# Altium integrated library Samtec 2 mm Pitch Terminal Strips.IntLib: 623 symbols (part 1 of 5)
Pins are listed as number, name and electrical type; pins without a type are passive.

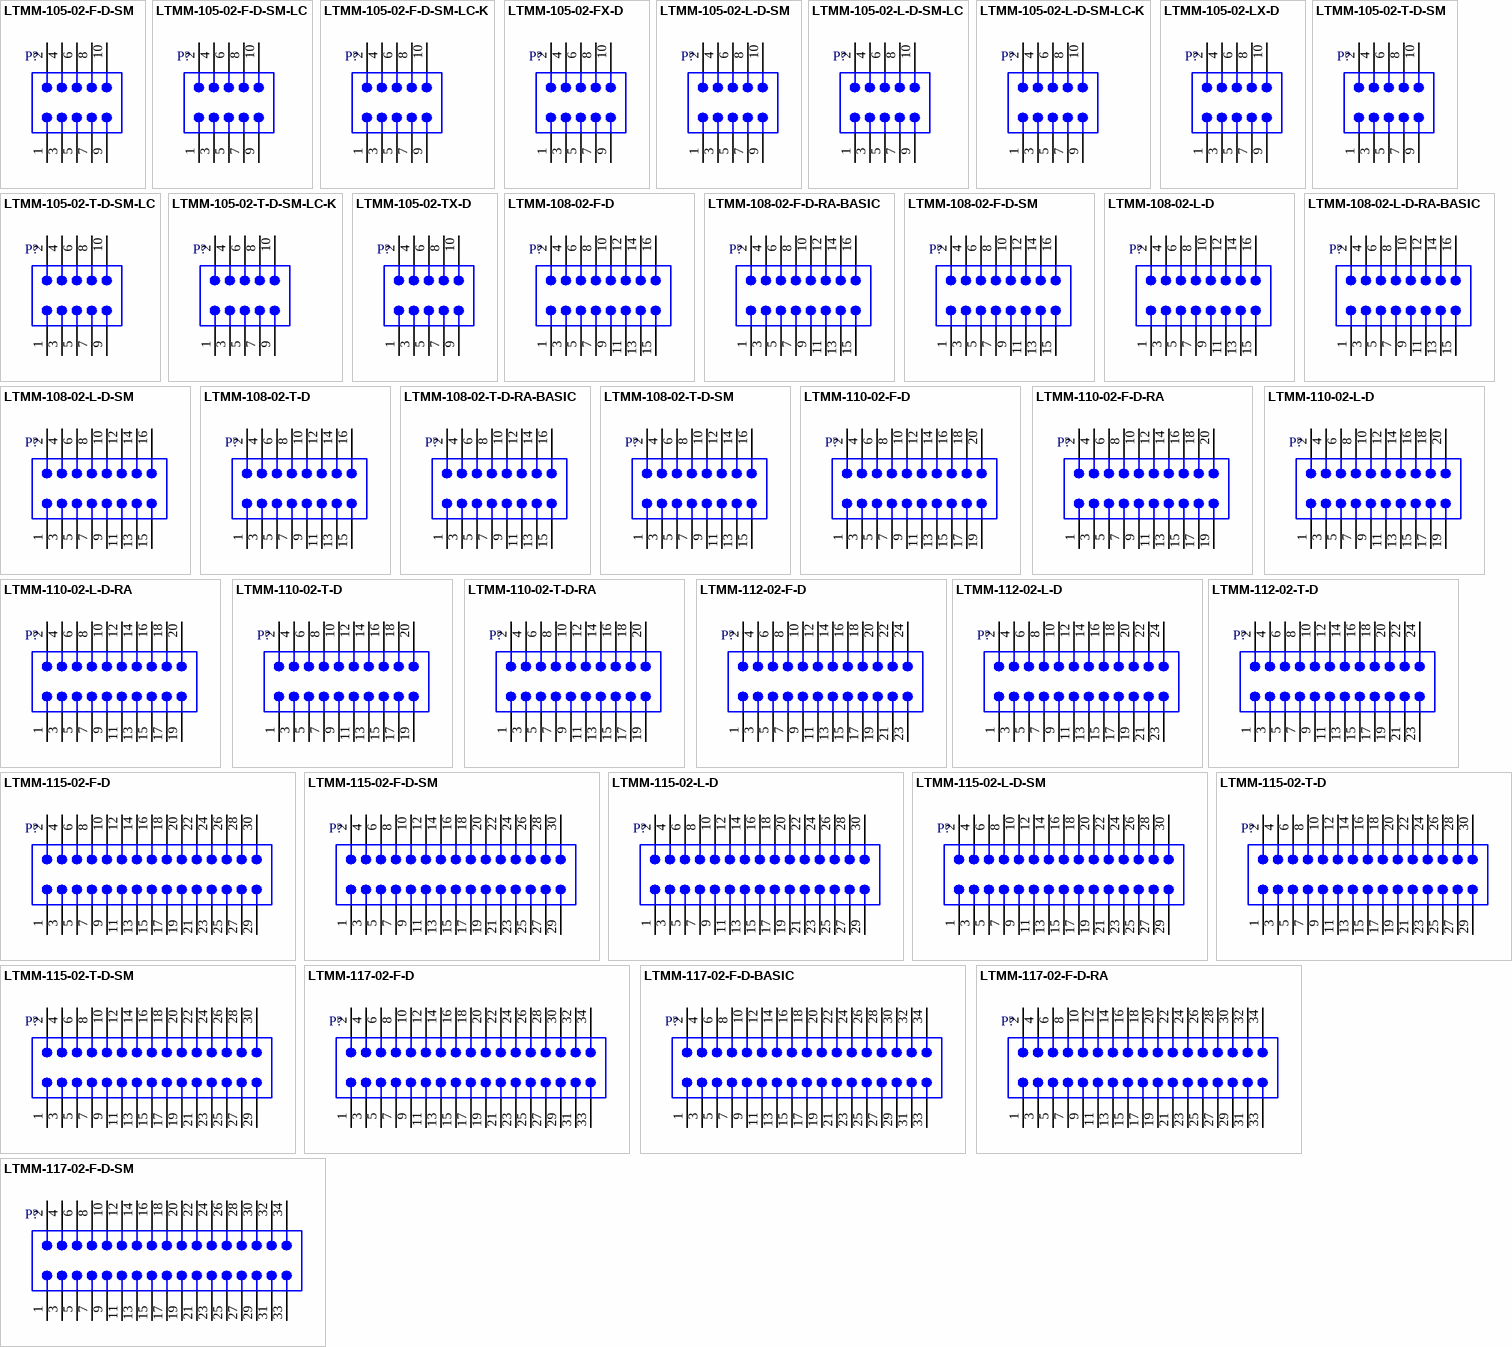
[diagram p0: symbols LTMM-105-02-F-D-SM to LTMM-117-02-F-D-SM]

## LTMM-105-02-F-D-SM
designator P?
Shrouded Header & Stacker, Surface Mount, Vertical, -55 to 125 degC, 2 mm Pitch, 10-Pin, Male, RoHS; Manufacturer: Samtec; PartNumber: LTMM-105-02-F-D-SM; Pitch: 2 mm; DatasheetVersion: F-214; PackageVersion: AQ, 5/1992; PackageReference: LTMM-105-02-X-D-SM; PackageDescription: LTMM Assembly; Orientation: Vertical; RoHS: True; Temperature Range: -55 to 125 degC; Mounting Technology: Surface Mount; ComponentLink1Description: Manufacturer URL; ComponentLink1URL: http://www.samtec.com; ComponentLink2Description: Datasheet; ComponentLink2URL: http://d2a072wq521u33.cloudfront.net/catalog_english//LTMM.PDF; ComponentLink3Description: Package Specification; ComponentLink3URL: http://www.samtec.com/documents/webfiles/cpdf/LTMM-1XX-XX-XX-D-XX-XX-MKT.pdf
footprint SMTC-LTMM-105-02-X-D-SM (Shrouded Header & Stacker, 2x5 Pins, Vertical, 2mm Pitch, Male)
pins: 1, 2, 3, 4, 5, 6, 7, 8, 9, 10

## LTMM-105-02-F-D-SM-LC
designator P?
Shrouded Header & Stacker, Surface Mount, Vertical, -55 to 125 degC, 2 mm Pitch, 10-Pin, Male, RoHS; Manufacturer: Samtec; PartNumber: LTMM-105-02-F-D-SM-LC; Pitch: 2 mm; DatasheetVersion: F-214; PackageVersion: AQ, 5/1992; PackageReference: LTMM-105-02-X-D-SM-LC; PackageDescription: LTMM Assembly; Orientation: Vertical; RoHS: True; Temperature Range: -55 to 125 degC; Mounting Technology: Surface Mount; ComponentLink1Description: Manufacturer URL; ComponentLink1URL: http://www.samtec.com; ComponentLink2Description: Datasheet; ComponentLink2URL: http://d2a072wq521u33.cloudfront.net/catalog_english//LTMM.PDF; ComponentLink3Description: Package Specification; ComponentLink3URL: http://www.samtec.com/documents/webfiles/cpdf/LTMM-1XX-XX-XX-D-XX-XX-MKT.pdf
footprint SMTC-LTMM-105-02-X-D-SM-LC (Shrouded Header & Stacker, 2x5 Pins, Vertical, 2mm Pitch, Male)
pins: 1, 2, 3, 4, 5, 6, 7, 8, 9, 10

## LTMM-105-02-F-D-SM-LC-K
designator P?
Shrouded Header & Stacker, Surface Mount, Vertical, -55 to 125 degC, 2 mm Pitch, 10-Pin, Male, RoHS; Manufacturer: Samtec; PartNumber: LTMM-105-02-F-D-SM-LC-K; Pitch: 2 mm; DatasheetVersion: F-214; PackageVersion: AQ, 5/1992; PackageReference: LTMM-105-02-X-D-SM-LC-K; PackageDescription: LTMM Assembly; Orientation: Vertical; RoHS: True; Temperature Range: -55 to 125 degC; Mounting Technology: Surface Mount; ComponentLink1Description: Manufacturer URL; ComponentLink1URL: http://www.samtec.com; ComponentLink2Description: Datasheet; ComponentLink2URL: http://d2a072wq521u33.cloudfront.net/catalog_english//LTMM.PDF; ComponentLink3Description: Package Specification; ComponentLink3URL: http://www.samtec.com/documents/webfiles/cpdf/LTMM-1XX-XX-XX-D-XX-XX-MKT.pdf
footprint SMTC-LTMM-105-02-X-D-SM-LC-K (Shrouded Header & Stacker, 2x5 Pins, Vertical, 2mm Pitch, Male)
pins: 1, 2, 3, 4, 5, 6, 7, 8, 9, 10

## LTMM-105-02-FX-D
designator P?
Shrouded Header & Stacker, Through-Hole, Vertical, -55 to 125 degC, 2 mm Pitch, 10-Pin, Male, RoHS; Manufacturer: Samtec; PartNumber: LTMM-105-02-FX-D; Pitch: 2 mm; DatasheetVersion: F-214; PackageVersion: AQ, 5/1992; PackageReference: LTMM-105-02-XX-D; PackageDescription: LTMM Assembly; Orientation: Vertical; RoHS: True; Temperature Range: -55 to 125 degC; Mounting Technology: Through-hole; ComponentLink1Description: Manufacturer URL; ComponentLink1URL: http://www.samtec.com; ComponentLink2Description: Datasheet; ComponentLink2URL: http://d2a072wq521u33.cloudfront.net/catalog_english//LTMM.PDF; ComponentLink3Description: Package Specification; ComponentLink3URL: http://www.samtec.com/documents/webfiles/cpdf/LTMM-1XX-XX-XX-D-XX-XX-MKT.pdf
footprint SMTC-LTMM-105-02-XX-D (Shrouded Header & Stacker, 2x5 Pins, Vertical, 2mm Pitch, Male)
pins: 1, 2, 3, 4, 5, 6, 7, 8, 9, 10

## LTMM-105-02-L-D-SM
designator P?
Shrouded Header & Stacker, Surface Mount, Vertical, -55 to 125 degC, 2 mm Pitch, 10-Pin, Male, RoHS; Manufacturer: Samtec; PartNumber: LTMM-105-02-L-D-SM; Pitch: 2 mm; DatasheetVersion: F-214; PackageVersion: AQ, 5/1992; PackageReference: LTMM-105-02-X-D-SM; PackageDescription: LTMM Assembly; Supplier 1: Newark; Supplier Part Number 1: 85T5470; Orientation: Vertical; RoHS: True; Temperature Range: -55 to 125 degC; Mounting Technology: Surface Mount; ComponentLink1Description: Manufacturer URL; ComponentLink1URL: http://www.samtec.com; ComponentLink2Description: Datasheet; ComponentLink2URL: http://d2a072wq521u33.cloudfront.net/catalog_english//LTMM.PDF; ComponentLink3Description: Package Specification; ComponentLink3URL: http://www.samtec.com/documents/webfiles/cpdf/LTMM-1XX-XX-XX-D-XX-XX-MKT.pdf
footprint SMTC-LTMM-105-02-X-D-SM (Shrouded Header & Stacker, 2x5 Pins, Vertical, 2mm Pitch, Male)
pins: 1, 2, 3, 4, 5, 6, 7, 8, 9, 10

## LTMM-105-02-L-D-SM-LC
designator P?
Shrouded Header & Stacker, Surface Mount, Vertical, -55 to 125 degC, 2 mm Pitch, 10-Pin, Male, RoHS; Manufacturer: Samtec; PartNumber: LTMM-105-02-L-D-SM-LC; Pitch: 2 mm; DatasheetVersion: F-214; PackageVersion: AQ, 5/1992; PackageReference: LTMM-105-02-X-D-SM-LC; PackageDescription: LTMM Assembly; Orientation: Vertical; RoHS: True; Temperature Range: -55 to 125 degC; Mounting Technology: Surface Mount; ComponentLink1Description: Manufacturer URL; ComponentLink1URL: http://www.samtec.com; ComponentLink2Description: Datasheet; ComponentLink2URL: http://d2a072wq521u33.cloudfront.net/catalog_english//LTMM.PDF; ComponentLink3Description: Package Specification; ComponentLink3URL: http://www.samtec.com/documents/webfiles/cpdf/LTMM-1XX-XX-XX-D-XX-XX-MKT.pdf
footprint SMTC-LTMM-105-02-X-D-SM-LC (Shrouded Header & Stacker, 2x5 Pins, Vertical, 2mm Pitch, Male)
pins: 1, 2, 3, 4, 5, 6, 7, 8, 9, 10

## LTMM-105-02-L-D-SM-LC-K
designator P?
Shrouded Header & Stacker, Surface Mount, Vertical, -55 to 125 degC, 2 mm Pitch, 10-Pin, Male, RoHS; Manufacturer: Samtec; PartNumber: LTMM-105-02-L-D-SM-LC-K; Pitch: 2 mm; DatasheetVersion: F-214; PackageVersion: AQ, 5/1992; PackageReference: LTMM-105-02-X-D-SM-LC-K; PackageDescription: LTMM Assembly; Orientation: Vertical; RoHS: True; Temperature Range: -55 to 125 degC; Mounting Technology: Surface Mount; ComponentLink1Description: Manufacturer URL; ComponentLink1URL: http://www.samtec.com; ComponentLink2Description: Datasheet; ComponentLink2URL: http://d2a072wq521u33.cloudfront.net/catalog_english//LTMM.PDF; ComponentLink3Description: Package Specification; ComponentLink3URL: http://www.samtec.com/documents/webfiles/cpdf/LTMM-1XX-XX-XX-D-XX-XX-MKT.pdf
footprint SMTC-LTMM-105-02-X-D-SM-LC-K (Shrouded Header & Stacker, 2x5 Pins, Vertical, 2mm Pitch, Male)
pins: 1, 2, 3, 4, 5, 6, 7, 8, 9, 10

## LTMM-105-02-LX-D
designator P?
Shrouded Header & Stacker, Through-Hole, Vertical, -55 to 125 degC, 2 mm Pitch, 10-Pin, Male, RoHS; Manufacturer: Samtec; PartNumber: LTMM-105-02-LX-D; Pitch: 2 mm; DatasheetVersion: F-214; PackageVersion: AQ, 5/1992; PackageReference: LTMM-105-02-XX-D; PackageDescription: LTMM Assembly; Orientation: Vertical; RoHS: True; Temperature Range: -55 to 125 degC; Mounting Technology: Through-hole; ComponentLink1Description: Manufacturer URL; ComponentLink1URL: http://www.samtec.com; ComponentLink2Description: Datasheet; ComponentLink2URL: http://d2a072wq521u33.cloudfront.net/catalog_english//LTMM.PDF; ComponentLink3Description: Package Specification; ComponentLink3URL: http://www.samtec.com/documents/webfiles/cpdf/LTMM-1XX-XX-XX-D-XX-XX-MKT.pdf
footprint SMTC-LTMM-105-02-XX-D (Shrouded Header & Stacker, 2x5 Pins, Vertical, 2mm Pitch, Male)
pins: 1, 2, 3, 4, 5, 6, 7, 8, 9, 10

## LTMM-105-02-T-D-SM
designator P?
Shrouded Header & Stacker, Surface Mount, Vertical, -55 to 105 degC, 2 mm Pitch, 10-Pin, Male, RoHS; Manufacturer: Samtec; PartNumber: LTMM-105-02-T-D-SM; Pitch: 2 mm; DatasheetVersion: F-214; PackageVersion: AQ, 5/1992; PackageReference: LTMM-105-02-X-D-SM; PackageDescription: LTMM Assembly; Supplier 1: Newark; Supplier Part Number 1: 85T5472; Orientation: Vertical; RoHS: True; Temperature Range: -55 to 105 degC; Mounting Technology: Surface Mount; ComponentLink1Description: Manufacturer URL; ComponentLink1URL: http://www.samtec.com; ComponentLink2Description: Datasheet; ComponentLink2URL: http://d2a072wq521u33.cloudfront.net/catalog_english//LTMM.PDF; ComponentLink3Description: Package Specification; ComponentLink3URL: http://www.samtec.com/documents/webfiles/cpdf/LTMM-1XX-XX-XX-D-XX-XX-MKT.pdf
footprint SMTC-LTMM-105-02-X-D-SM (Shrouded Header & Stacker, 2x5 Pins, Vertical, 2mm Pitch, Male)
pins: 1, 2, 3, 4, 5, 6, 7, 8, 9, 10

## LTMM-105-02-T-D-SM-LC
designator P?
Shrouded Header & Stacker, Surface Mount, Vertical, -55 to 105 degC, 2 mm Pitch, 10-Pin, Male, RoHS; Manufacturer: Samtec; PartNumber: LTMM-105-02-T-D-SM-LC; Pitch: 2 mm; DatasheetVersion: F-214; PackageVersion: AQ, 5/1992; PackageReference: LTMM-105-02-X-D-SM-LC; PackageDescription: LTMM Assembly; Orientation: Vertical; RoHS: True; Temperature Range: -55 to 105 degC; Mounting Technology: Surface Mount; ComponentLink1Description: Manufacturer URL; ComponentLink1URL: http://www.samtec.com; ComponentLink2Description: Datasheet; ComponentLink2URL: http://d2a072wq521u33.cloudfront.net/catalog_english//LTMM.PDF; ComponentLink3Description: Package Specification; ComponentLink3URL: http://www.samtec.com/documents/webfiles/cpdf/LTMM-1XX-XX-XX-D-XX-XX-MKT.pdf
footprint SMTC-LTMM-105-02-X-D-SM-LC (Shrouded Header & Stacker, 2x5 Pins, Vertical, 2mm Pitch, Male)
pins: 1, 2, 3, 4, 5, 6, 7, 8, 9, 10

## LTMM-105-02-T-D-SM-LC-K
designator P?
Shrouded Header & Stacker, Surface Mount, Vertical, -55 to 105 degC, 2 mm Pitch, 10-Pin, Male, RoHS; Manufacturer: Samtec; PartNumber: LTMM-105-02-T-D-SM-LC-K; Pitch: 2 mm; DatasheetVersion: F-214; PackageVersion: AQ, 5/1992; PackageReference: LTMM-105-02-X-D-SM-LC-K; PackageDescription: LTMM Assembly; Orientation: Vertical; RoHS: True; Temperature Range: -55 to 105 degC; Mounting Technology: Surface Mount; ComponentLink1Description: Manufacturer URL; ComponentLink1URL: http://www.samtec.com; ComponentLink2Description: Datasheet; ComponentLink2URL: http://d2a072wq521u33.cloudfront.net/catalog_english//LTMM.PDF; ComponentLink3Description: Package Specification; ComponentLink3URL: http://www.samtec.com/documents/webfiles/cpdf/LTMM-1XX-XX-XX-D-XX-XX-MKT.pdf
footprint SMTC-LTMM-105-02-X-D-SM-LC-K (Shrouded Header & Stacker, 2x5 Pins, Vertical, 2mm Pitch, Male)
pins: 1, 2, 3, 4, 5, 6, 7, 8, 9, 10

## LTMM-105-02-TX-D
designator P?
Shrouded Header & Stacker, Through-Hole, Vertical, -55 to 105 degC, 2 mm Pitch, 10-Pin, Male, RoHS; Manufacturer: Samtec; PartNumber: LTMM-105-02-TX-D; Pitch: 2 mm; DatasheetVersion: F-214; PackageVersion: AQ, 5/1992; PackageReference: LTMM-105-02-XX-D; PackageDescription: LTMM Assembly; Orientation: Vertical; RoHS: True; Temperature Range: -55 to 105 degC; Mounting Technology: Through-hole; ComponentLink1Description: Manufacturer URL; ComponentLink1URL: http://www.samtec.com; ComponentLink2Description: Datasheet; ComponentLink2URL: http://d2a072wq521u33.cloudfront.net/catalog_english//LTMM.PDF; ComponentLink3Description: Package Specification; ComponentLink3URL: http://www.samtec.com/documents/webfiles/cpdf/LTMM-1XX-XX-XX-D-XX-XX-MKT.pdf
footprint SMTC-LTMM-105-02-XX-D (Shrouded Header & Stacker, 2x5 Pins, Vertical, 2mm Pitch, Male)
pins: 1, 2, 3, 4, 5, 6, 7, 8, 9, 10

## LTMM-108-02-F-D
designator P?
Shrouded Header & Stacker, Through-Hole, Vertical, -55 to 125 degC, 2 mm Pitch, 16-Pin, Male, RoHS; Manufacturer: Samtec; PartNumber: LTMM-108-02-F-D; Pitch: 2 mm; DatasheetVersion: F-214; PackageVersion: AQ, 5/1992; PackageReference: LTMM-108-02-X-D; PackageDescription: LTMM Assembly; Orientation: Vertical; RoHS: True; Temperature Range: -55 to 125 degC; Mounting Technology: Through-hole; ComponentLink1Description: Manufacturer URL; ComponentLink1URL: http://www.samtec.com; ComponentLink2Description: Datasheet; ComponentLink2URL: http://d2a072wq521u33.cloudfront.net/catalog_english//LTMM.PDF; ComponentLink3Description: Package Specification; ComponentLink3URL: http://www.samtec.com/documents/webfiles/cpdf/LTMM-1XX-XX-XX-D-XX-XX-MKT.pdf
footprint SMTC-LTMM-108-02-X-D (Shrouded Header & Stacker, 2x8 Pins, Vertical, 2mm Pitch, Male)
pins: 1, 2, 3, 4, 5, 6, 7, 8, 9, 10, 11, 12, 13, 14, 15, 16

## LTMM-108-02-F-D-RA-BASIC
designator P?
Shrouded Header & Stacker, Through-Hole, Right Angle, -55 to 125 degC, 2 mm Pitch, 16-Pin, Male, RoHS; Manufacturer: Samtec; PartNumber: LTMM-108-02-F-D-RA-BASIC; Pitch: 2 mm; DatasheetVersion: F-214; PackageVersion: AQ, 5/1992; PackageReference: LTMM-108-02-X-D-RA-BASIC; PackageDescription: LTMM Assembly; Orientation: Right Angle; RoHS: True; Temperature Range: -55 to 125 degC; Mounting Technology: Through-hole; ComponentLink1Description: Manufacturer URL; ComponentLink1URL: http://www.samtec.com; ComponentLink2Description: Datasheet; ComponentLink2URL: http://d2a072wq521u33.cloudfront.net/catalog_english//LTMM.PDF; ComponentLink3Description: Package Specification; ComponentLink3URL: http://www.samtec.com/documents/webfiles/cpdf/LTMM-1XX-XX-XX-D-XX-XX-MKT.pdf
footprint SMTC-LTMM-108-02-X-D-RA-BASIC (Shrouded Header & Stacker, 2x8 Pins, Right Angle, 2mm Pitch, Male)
pins: 1, 2, 3, 4, 5, 6, 7, 8, 9, 10, 11, 12, 13, 14, 15, 16

## LTMM-108-02-F-D-SM
designator P?
Shrouded Header & Stacker, Surface Mount, Vertical, -55 to 125 degC, 2 mm Pitch, 16-Pin, Male, RoHS; Manufacturer: Samtec; PartNumber: LTMM-108-02-F-D-SM; Pitch: 2 mm; DatasheetVersion: F-214; PackageVersion: AQ, 5/1992; PackageReference: LTMM-108-02-X-D-SM; PackageDescription: LTMM Assembly; Orientation: Vertical; RoHS: True; Temperature Range: -55 to 125 degC; Mounting Technology: Surface Mount; ComponentLink1Description: Manufacturer URL; ComponentLink1URL: http://www.samtec.com; ComponentLink2Description: Datasheet; ComponentLink2URL: http://d2a072wq521u33.cloudfront.net/catalog_english//LTMM.PDF; ComponentLink3Description: Package Specification; ComponentLink3URL: http://www.samtec.com/documents/webfiles/cpdf/LTMM-1XX-XX-XX-D-XX-XX-MKT.pdf
footprint SMTC-LTMM-108-02-X-D-SM (Shrouded Header & Stacker, 2x8 Pins, Vertical, 2mm Pitch, Male)
pins: 1, 2, 3, 4, 5, 6, 7, 8, 9, 10, 11, 12, 13, 14, 15, 16

## LTMM-108-02-L-D
designator P?
Shrouded Header & Stacker, Through-Hole, Vertical, -55 to 125 degC, 2 mm Pitch, 16-Pin, Male, RoHS; Manufacturer: Samtec; PartNumber: LTMM-108-02-L-D; Pitch: 2 mm; DatasheetVersion: F-214; PackageVersion: AQ, 5/1992; PackageReference: LTMM-108-02-X-D; PackageDescription: LTMM Assembly; Orientation: Vertical; RoHS: True; Temperature Range: -55 to 125 degC; Mounting Technology: Through-hole; ComponentLink1Description: Manufacturer URL; ComponentLink1URL: http://www.samtec.com; ComponentLink2Description: Datasheet; ComponentLink2URL: http://d2a072wq521u33.cloudfront.net/catalog_english//LTMM.PDF; ComponentLink3Description: Package Specification; ComponentLink3URL: http://www.samtec.com/documents/webfiles/cpdf/LTMM-1XX-XX-XX-D-XX-XX-MKT.pdf
footprint SMTC-LTMM-108-02-X-D (Shrouded Header & Stacker, 2x8 Pins, Vertical, 2mm Pitch, Male)
pins: 1, 2, 3, 4, 5, 6, 7, 8, 9, 10, 11, 12, 13, 14, 15, 16

## LTMM-108-02-L-D-RA-BASIC
designator P?
Shrouded Header & Stacker, Through-Hole, Right Angle, -55 to 125 degC, 2 mm Pitch, 16-Pin, Male, RoHS; Manufacturer: Samtec; PartNumber: LTMM-108-02-L-D-RA-BASIC; Pitch: 2 mm; DatasheetVersion: F-214; PackageVersion: AQ, 5/1992; PackageReference: LTMM-108-02-X-D-RA-BASIC; PackageDescription: LTMM Assembly; Orientation: Right Angle; RoHS: True; Temperature Range: -55 to 125 degC; Mounting Technology: Through-hole; ComponentLink1Description: Manufacturer URL; ComponentLink1URL: http://www.samtec.com; ComponentLink2Description: Datasheet; ComponentLink2URL: http://d2a072wq521u33.cloudfront.net/catalog_english//LTMM.PDF; ComponentLink3Description: Package Specification; ComponentLink3URL: http://www.samtec.com/documents/webfiles/cpdf/LTMM-1XX-XX-XX-D-XX-XX-MKT.pdf
footprint SMTC-LTMM-108-02-X-D-RA-BASIC (Shrouded Header & Stacker, 2x8 Pins, Right Angle, 2mm Pitch, Male)
pins: 1, 2, 3, 4, 5, 6, 7, 8, 9, 10, 11, 12, 13, 14, 15, 16

## LTMM-108-02-L-D-SM
designator P?
Shrouded Header & Stacker, Surface Mount, Vertical, -55 to 125 degC, 2 mm Pitch, 16-Pin, Male, RoHS; Manufacturer: Samtec; PartNumber: LTMM-108-02-L-D-SM; Pitch: 2 mm; DatasheetVersion: F-214; PackageVersion: AQ, 5/1992; PackageReference: LTMM-108-02-X-D-SM; PackageDescription: LTMM Assembly; Orientation: Vertical; RoHS: True; Temperature Range: -55 to 125 degC; Mounting Technology: Surface Mount; ComponentLink1Description: Manufacturer URL; ComponentLink1URL: http://www.samtec.com; ComponentLink2Description: Datasheet; ComponentLink2URL: http://d2a072wq521u33.cloudfront.net/catalog_english//LTMM.PDF; ComponentLink3Description: Package Specification; ComponentLink3URL: http://www.samtec.com/documents/webfiles/cpdf/LTMM-1XX-XX-XX-D-XX-XX-MKT.pdf
footprint SMTC-LTMM-108-02-X-D-SM (Shrouded Header & Stacker, 2x8 Pins, Vertical, 2mm Pitch, Male)
pins: 1, 2, 3, 4, 5, 6, 7, 8, 9, 10, 11, 12, 13, 14, 15, 16

## LTMM-108-02-T-D
designator P?
Shrouded Header & Stacker, Through-Hole, Vertical, -55 to 105 degC, 2 mm Pitch, 16-Pin, Male, RoHS; Manufacturer: Samtec; PartNumber: LTMM-108-02-T-D; Pitch: 2 mm; DatasheetVersion: F-214; PackageVersion: AQ, 5/1992; PackageReference: LTMM-108-02-X-D; PackageDescription: LTMM Assembly; Orientation: Vertical; RoHS: True; Temperature Range: -55 to 105 degC; Mounting Technology: Through-hole; ComponentLink1Description: Manufacturer URL; ComponentLink1URL: http://www.samtec.com; ComponentLink2Description: Datasheet; ComponentLink2URL: http://d2a072wq521u33.cloudfront.net/catalog_english//LTMM.PDF; ComponentLink3Description: Package Specification; ComponentLink3URL: http://www.samtec.com/documents/webfiles/cpdf/LTMM-1XX-XX-XX-D-XX-XX-MKT.pdf
footprint SMTC-LTMM-108-02-X-D (Shrouded Header & Stacker, 2x8 Pins, Vertical, 2mm Pitch, Male)
pins: 1, 2, 3, 4, 5, 6, 7, 8, 9, 10, 11, 12, 13, 14, 15, 16

## LTMM-108-02-T-D-RA-BASIC
designator P?
Shrouded Header & Stacker, Through-Hole, Right Angle, -55 to 105 degC, 2 mm Pitch, 16-Pin, Male, RoHS; Manufacturer: Samtec; PartNumber: LTMM-108-02-T-D-RA-BASIC; Pitch: 2 mm; DatasheetVersion: F-214; PackageVersion: AQ, 5/1992; PackageReference: LTMM-108-02-X-D-RA-BASIC; PackageDescription: LTMM Assembly; Orientation: Right Angle; RoHS: True; Temperature Range: -55 to 105 degC; Mounting Technology: Through-hole; ComponentLink1Description: Manufacturer URL; ComponentLink1URL: http://www.samtec.com; ComponentLink2Description: Datasheet; ComponentLink2URL: http://d2a072wq521u33.cloudfront.net/catalog_english//LTMM.PDF; ComponentLink3Description: Package Specification; ComponentLink3URL: http://www.samtec.com/documents/webfiles/cpdf/LTMM-1XX-XX-XX-D-XX-XX-MKT.pdf
footprint SMTC-LTMM-108-02-X-D-RA-BASIC (Shrouded Header & Stacker, 2x8 Pins, Right Angle, 2mm Pitch, Male)
pins: 1, 2, 3, 4, 5, 6, 7, 8, 9, 10, 11, 12, 13, 14, 15, 16

## LTMM-108-02-T-D-SM
designator P?
Shrouded Header & Stacker, Surface Mount, Vertical, -55 to 105 degC, 2 mm Pitch, 16-Pin, Male, RoHS; Manufacturer: Samtec; PartNumber: LTMM-108-02-T-D-SM; Pitch: 2 mm; DatasheetVersion: F-214; PackageVersion: AQ, 5/1992; PackageReference: LTMM-108-02-X-D-SM; PackageDescription: LTMM Assembly; Orientation: Vertical; RoHS: True; Temperature Range: -55 to 105 degC; Mounting Technology: Surface Mount; ComponentLink1Description: Manufacturer URL; ComponentLink1URL: http://www.samtec.com; ComponentLink2Description: Datasheet; ComponentLink2URL: http://d2a072wq521u33.cloudfront.net/catalog_english//LTMM.PDF; ComponentLink3Description: Package Specification; ComponentLink3URL: http://www.samtec.com/documents/webfiles/cpdf/LTMM-1XX-XX-XX-D-XX-XX-MKT.pdf
footprint SMTC-LTMM-108-02-X-D-SM (Shrouded Header & Stacker, 2x8 Pins, Vertical, 2mm Pitch, Male)
pins: 1, 2, 3, 4, 5, 6, 7, 8, 9, 10, 11, 12, 13, 14, 15, 16

## LTMM-110-02-F-D
designator P?
Shrouded Header & Stacker, Through-Hole, Vertical, -55 to 125 degC, 2 mm Pitch, 20-Pin, Male, RoHS; Manufacturer: Samtec; PartNumber: LTMM-110-02-F-D; Pitch: 2 mm; DatasheetVersion: F-214; PackageVersion: AQ, 5/1992; PackageReference: LTMM-110-02-X-D; PackageDescription: LTMM Assembly; Orientation: Vertical; RoHS: True; Temperature Range: -55 to 125 degC; Mounting Technology: Through-hole; ComponentLink1Description: Manufacturer URL; ComponentLink1URL: http://www.samtec.com; ComponentLink2Description: Datasheet; ComponentLink2URL: http://d2a072wq521u33.cloudfront.net/catalog_english//LTMM.PDF; ComponentLink3Description: Package Specification; ComponentLink3URL: http://www.samtec.com/documents/webfiles/cpdf/LTMM-1XX-XX-XX-D-XX-XX-MKT.pdf
footprint SMTC-LTMM-110-02-X-D (Shrouded Header & Stacker, 2x10 Pins, Vertical, 2mm Pitch, Male)
pins: 1, 2, 3, 4, 5, 6, 7, 8, 9, 10, 11, 12, 13, 14, 15, 16, 17, 18, 19, 20

## LTMM-110-02-F-D-RA
designator P?
Shrouded Header & Stacker, Through-Hole, Right Angle, -55 to 125 degC, 2 mm Pitch, 20-Pin, Male, RoHS; Manufacturer: Samtec; PartNumber: LTMM-110-02-F-D-RA; Pitch: 2 mm; DatasheetVersion: F-214; PackageVersion: AQ, 5/1992; PackageReference: LTMM-110-02-X-D-RA; PackageDescription: LTMM Assembly; Orientation: Right Angle; RoHS: True; Temperature Range: -55 to 125 degC; Mounting Technology: Through-hole; ComponentLink1Description: Manufacturer URL; ComponentLink1URL: http://www.samtec.com; ComponentLink2Description: Datasheet; ComponentLink2URL: http://d2a072wq521u33.cloudfront.net/catalog_english//LTMM.PDF; ComponentLink3Description: Package Specification; ComponentLink3URL: http://www.samtec.com/documents/webfiles/cpdf/LTMM-1XX-XX-XX-D-XX-XX-MKT.pdf
footprint SMTC-LTMM-110-02-X-D-RA (Shrouded Header & Stacker, 2x10 Pins, Right Angle, 2mm Pitch, Male)
pins: 1, 2, 3, 4, 5, 6, 7, 8, 9, 10, 11, 12, 13, 14, 15, 16, 17, 18, 19, 20

## LTMM-110-02-L-D
designator P?
Shrouded Header & Stacker, Through-Hole, Vertical, -55 to 125 degC, 2 mm Pitch, 20-Pin, Male, RoHS; Manufacturer: Samtec; PartNumber: LTMM-110-02-L-D; Pitch: 2 mm; DatasheetVersion: F-214; PackageVersion: AQ, 5/1992; PackageReference: LTMM-110-02-X-D; PackageDescription: LTMM Assembly; Supplier 1: Newark; Supplier Part Number 1: 85T5479; Orientation: Vertical; RoHS: True; Temperature Range: -55 to 125 degC; Mounting Technology: Through-hole; ComponentLink1Description: Manufacturer URL; ComponentLink1URL: http://www.samtec.com; ComponentLink2Description: Datasheet; ComponentLink2URL: http://d2a072wq521u33.cloudfront.net/catalog_english//LTMM.PDF; ComponentLink3Description: Package Specification; ComponentLink3URL: http://www.samtec.com/documents/webfiles/cpdf/LTMM-1XX-XX-XX-D-XX-XX-MKT.pdf
footprint SMTC-LTMM-110-02-X-D (Shrouded Header & Stacker, 2x10 Pins, Vertical, 2mm Pitch, Male)
pins: 1, 2, 3, 4, 5, 6, 7, 8, 9, 10, 11, 12, 13, 14, 15, 16, 17, 18, 19, 20

## LTMM-110-02-L-D-RA
designator P?
Shrouded Header & Stacker, Through-Hole, Right Angle, -55 to 125 degC, 2 mm Pitch, 20-Pin, Male, RoHS; Manufacturer: Samtec; PartNumber: LTMM-110-02-L-D-RA; Pitch: 2 mm; DatasheetVersion: F-214; PackageVersion: AQ, 5/1992; PackageReference: LTMM-110-02-X-D-RA; PackageDescription: LTMM Assembly; Supplier 1: Newark; Supplier Part Number 1: 85T5480; Orientation: Right Angle; RoHS: True; Temperature Range: -55 to 125 degC; Mounting Technology: Through-hole; ComponentLink1Description: Manufacturer URL; ComponentLink1URL: http://www.samtec.com; ComponentLink2Description: Datasheet; ComponentLink2URL: http://d2a072wq521u33.cloudfront.net/catalog_english//LTMM.PDF; ComponentLink3Description: Package Specification; ComponentLink3URL: http://www.samtec.com/documents/webfiles/cpdf/LTMM-1XX-XX-XX-D-XX-XX-MKT.pdf
footprint SMTC-LTMM-110-02-X-D-RA (Shrouded Header & Stacker, 2x10 Pins, Right Angle, 2mm Pitch, Male)
pins: 1, 2, 3, 4, 5, 6, 7, 8, 9, 10, 11, 12, 13, 14, 15, 16, 17, 18, 19, 20

## LTMM-110-02-T-D
designator P?
Shrouded Header & Stacker, Through-Hole, Vertical, -55 to 105 degC, 2 mm Pitch, 20-Pin, Male, RoHS; Manufacturer: Samtec; PartNumber: LTMM-110-02-T-D; Pitch: 2 mm; DatasheetVersion: F-214; PackageVersion: AQ, 5/1992; PackageReference: LTMM-110-02-X-D; PackageDescription: LTMM Assembly; Supplier 1: Newark; Supplier Part Number 1: 85T5481; Orientation: Vertical; RoHS: True; Temperature Range: -55 to 105 degC; Mounting Technology: Through-hole; ComponentLink1Description: Manufacturer URL; ComponentLink1URL: http://www.samtec.com; ComponentLink2Description: Datasheet; ComponentLink2URL: http://d2a072wq521u33.cloudfront.net/catalog_english//LTMM.PDF; ComponentLink3Description: Package Specification; ComponentLink3URL: http://www.samtec.com/documents/webfiles/cpdf/LTMM-1XX-XX-XX-D-XX-XX-MKT.pdf
footprint SMTC-LTMM-110-02-X-D (Shrouded Header & Stacker, 2x10 Pins, Vertical, 2mm Pitch, Male)
pins: 1, 2, 3, 4, 5, 6, 7, 8, 9, 10, 11, 12, 13, 14, 15, 16, 17, 18, 19, 20

## LTMM-110-02-T-D-RA
designator P?
Shrouded Header & Stacker, Through-Hole, Right Angle, -55 to 105 degC, 2 mm Pitch, 20-Pin, Male, RoHS; Manufacturer: Samtec; PartNumber: LTMM-110-02-T-D-RA; Pitch: 2 mm; DatasheetVersion: F-214; PackageVersion: AQ, 5/1992; PackageReference: LTMM-110-02-X-D-RA; PackageDescription: LTMM Assembly; Supplier 1: Newark; Supplier Part Number 1: 85T5482; Orientation: Right Angle; RoHS: True; Temperature Range: -55 to 105 degC; Mounting Technology: Through-hole; ComponentLink1Description: Manufacturer URL; ComponentLink1URL: http://www.samtec.com; ComponentLink2Description: Datasheet; ComponentLink2URL: http://d2a072wq521u33.cloudfront.net/catalog_english//LTMM.PDF; ComponentLink3Description: Package Specification; ComponentLink3URL: http://www.samtec.com/documents/webfiles/cpdf/LTMM-1XX-XX-XX-D-XX-XX-MKT.pdf
footprint SMTC-LTMM-110-02-X-D-RA (Shrouded Header & Stacker, 2x10 Pins, Right Angle, 2mm Pitch, Male)
pins: 1, 2, 3, 4, 5, 6, 7, 8, 9, 10, 11, 12, 13, 14, 15, 16, 17, 18, 19, 20

## LTMM-112-02-F-D
designator P?
Shrouded Header & Stacker, Through-Hole, Vertical, -55 to 125 degC, 2 mm Pitch, 24-Pin, Male, RoHS; Manufacturer: Samtec; PartNumber: LTMM-112-02-F-D; Pitch: 2 mm; DatasheetVersion: F-214; PackageVersion: AQ, 5/1992; PackageReference: LTMM-112-02-X-D; PackageDescription: LTMM Assembly; Orientation: Vertical; RoHS: True; Temperature Range: -55 to 125 degC; Mounting Technology: Through-hole; ComponentLink1Description: Manufacturer URL; ComponentLink1URL: http://www.samtec.com; ComponentLink2Description: Datasheet; ComponentLink2URL: http://d2a072wq521u33.cloudfront.net/catalog_english//LTMM.PDF; ComponentLink3Description: Package Specification; ComponentLink3URL: http://www.samtec.com/documents/webfiles/cpdf/LTMM-1XX-XX-XX-D-XX-XX-MKT.pdf
footprint SMTC-LTMM-112-02-X-D (Shrouded Header & Stacker, 2x12 Pins, Vertical, 2mm Pitch, Male)
pins: 1, 2, 3, 4, 5, 6, 7, 8, 9, 10, 11, 12, 13, 14, 15, 16, 17, 18, 19, 20, 21, 22, 23, 24

## LTMM-112-02-L-D
designator P?
Shrouded Header & Stacker, Through-Hole, Vertical, -55 to 125 degC, 2 mm Pitch, 24-Pin, Male, RoHS; Manufacturer: Samtec; PartNumber: LTMM-112-02-L-D; Pitch: 2 mm; DatasheetVersion: F-214; PackageVersion: AQ, 5/1992; PackageReference: LTMM-112-02-X-D; PackageDescription: LTMM Assembly; Supplier 1: Newark; Supplier Part Number 1: 85T5484; Orientation: Vertical; RoHS: True; Temperature Range: -55 to 125 degC; Mounting Technology: Through-hole; ComponentLink1Description: Manufacturer URL; ComponentLink1URL: http://www.samtec.com; ComponentLink2Description: Datasheet; ComponentLink2URL: http://d2a072wq521u33.cloudfront.net/catalog_english//LTMM.PDF; ComponentLink3Description: Package Specification; ComponentLink3URL: http://www.samtec.com/documents/webfiles/cpdf/LTMM-1XX-XX-XX-D-XX-XX-MKT.pdf
footprint SMTC-LTMM-112-02-X-D (Shrouded Header & Stacker, 2x12 Pins, Vertical, 2mm Pitch, Male)
pins: 1, 2, 3, 4, 5, 6, 7, 8, 9, 10, 11, 12, 13, 14, 15, 16, 17, 18, 19, 20, 21, 22, 23, 24

## LTMM-112-02-T-D
designator P?
Shrouded Header & Stacker, Through-Hole, Vertical, -55 to 105 degC, 2 mm Pitch, 24-Pin, Male, RoHS; Manufacturer: Samtec; PartNumber: LTMM-112-02-T-D; Pitch: 2 mm; DatasheetVersion: F-214; PackageVersion: AQ, 5/1992; PackageReference: LTMM-112-02-X-D; PackageDescription: LTMM Assembly; Supplier 1: Newark; Supplier Part Number 1: 85T5486; Orientation: Vertical; RoHS: True; Temperature Range: -55 to 105 degC; Mounting Technology: Through-hole; ComponentLink1Description: Manufacturer URL; ComponentLink1URL: http://www.samtec.com; ComponentLink2Description: Datasheet; ComponentLink2URL: http://d2a072wq521u33.cloudfront.net/catalog_english//LTMM.PDF; ComponentLink3Description: Package Specification; ComponentLink3URL: http://www.samtec.com/documents/webfiles/cpdf/LTMM-1XX-XX-XX-D-XX-XX-MKT.pdf
footprint SMTC-LTMM-112-02-X-D (Shrouded Header & Stacker, 2x12 Pins, Vertical, 2mm Pitch, Male)
pins: 1, 2, 3, 4, 5, 6, 7, 8, 9, 10, 11, 12, 13, 14, 15, 16, 17, 18, 19, 20, 21, 22, 23, 24

## LTMM-115-02-F-D
designator P?
Shrouded Header & Stacker, Through-Hole, Vertical, -55 to 125 degC, 2 mm Pitch, 30-Pin, Male, RoHS; Manufacturer: Samtec; PartNumber: LTMM-115-02-F-D; Pitch: 2 mm; DatasheetVersion: F-214; PackageVersion: AQ, 5/1992; PackageReference: LTMM-115-02-X-D; PackageDescription: LTMM Assembly; Orientation: Vertical; RoHS: True; Temperature Range: -55 to 125 degC; Mounting Technology: Through-hole; ComponentLink1Description: Manufacturer URL; ComponentLink1URL: http://www.samtec.com; ComponentLink2Description: Datasheet; ComponentLink2URL: http://d2a072wq521u33.cloudfront.net/catalog_english//LTMM.PDF; ComponentLink3Description: Package Specification; ComponentLink3URL: http://www.samtec.com/documents/webfiles/cpdf/LTMM-1XX-XX-XX-D-XX-XX-MKT.pdf
footprint SMTC-LTMM-115-02-X-D (Shrouded Header & Stacker, 2x15 Pins, Vertical, 2mm Pitch, Male)
pins: 1, 2, 3, 4, 5, 6, 7, 8, 9, 10, 11, 12, 13, 14, 15, 16, 17, 18, 19, 20, 21, 22, 23, 24, 25, 26, 27, 28, 29, 30

## LTMM-115-02-F-D-SM
designator P?
Shrouded Header & Stacker, Surface Mount, Vertical, -55 to 125 degC, 2 mm Pitch, 30-Pin, Male, RoHS; Manufacturer: Samtec; PartNumber: LTMM-115-02-F-D-SM; Pitch: 2 mm; DatasheetVersion: F-214; PackageVersion: AQ, 5/1992; PackageReference: LTMM-115-02-X-D-SM; PackageDescription: LTMM Assembly; Orientation: Vertical; RoHS: True; Temperature Range: -55 to 125 degC; Mounting Technology: Surface Mount; ComponentLink1Description: Manufacturer URL; ComponentLink1URL: http://www.samtec.com; ComponentLink2Description: Datasheet; ComponentLink2URL: http://d2a072wq521u33.cloudfront.net/catalog_english//LTMM.PDF; ComponentLink3Description: Package Specification; ComponentLink3URL: http://www.samtec.com/documents/webfiles/cpdf/LTMM-1XX-XX-XX-D-XX-XX-MKT.pdf
footprint SMTC-LTMM-115-02-X-D-SM (Shrouded Header & Stacker, 2x15 Pins, Vertical, 2mm Pitch, Male)
pins: 1, 2, 3, 4, 5, 6, 7, 8, 9, 10, 11, 12, 13, 14, 15, 16, 17, 18, 19, 20, 21, 22, 23, 24, 25, 26, 27, 28, 29, 30
